# Altium footprint library Connector_PinHeader_2.00mm.PcbLib: 278 footprints (part 13 of 18) (continued)
## PinHeader_2x15_P2.00mm_Horizontal [mm] (continued)
F.CrtYd:
  lines w0.05: -1.5,-29.5 9.7,-29.5 9.7,1.5 -1.5,1.5 -1.5,-29.5
F.Fab:
  lines w0.1: 3.5,-28.25 -0.25,-28.25 -0.25,-27.75 3.5,-27.75 ; 3.5,-26.25 -0.25,-26.25 -0.25,-25.75 3.5,-25.75 ; 3.5,-24.25 -0.25,-24.25 -0.25,-23.75 3.5,-23.75 ; 3.5,-22.25 -0.25,-22.25 -0.25,-21.75 3.5,-21.75 ; 3.5,-20.25 -0.25,-20.25 -0.25,-19.75 3.5,-19.75 ; 3.5,-18.25 -0.25,-18.25 -0.25,-17.75 3.5,-17.75 ; 3.5,-16.25 -0.25,-16.25 -0.25,-15.75 3.5,-15.75 ; 3.5,-14.25 -0.25,-14.25 -0.25,-13.75 3.5,-13.75 ; 3.5,-12.25 -0.25,-12.25 -0.25,-11.75 3.5,-11.75 ; 3.5,-10.25 -0.25,-10.25 -0.25,-9.75 3.5,-9.75 ; 3.5,-8.25 -0.25,-8.25 -0.25,-7.75 3.5,-7.75 ; 3.5,-6.25 -0.25,-6.25 -0.25,-5.75 3.5,-5.75 ; 3.5,-4.25 -0.25,-4.25 -0.25,-3.75 3.5,-3.75 ; 3.5,-2.25 -0.25,-2.25 -0.25,-1.75 3.5,-1.75 ; 3.5,-0.25 -0.25,-0.25 -0.25,0.25 3.5,0.25 ; 5,-28.25 9.2,-28.25 9.2,-27.75 5,-27.75 ; 5,-26.25 9.2,-26.25 9.2,-25.75 5,-25.75 ; 5,-24.25 9.2,-24.25 9.2,-23.75 5,-23.75 ; 5,-22.25 9.2,-22.25 9.2,-21.75 5,-21.75 ; 5,-20.25 9.2,-20.25 9.2,-19.75 5,-19.75 ; 5,-18.25 9.2,-18.25 9.2,-17.75 5,-17.75 ; 5,-16.25 9.2,-16.25 9.2,-15.75 5,-15.75 ; 5,-14.25 9.2,-14.25 9.2,-13.75 5,-13.75 ; 5,-12.25 9.2,-12.25 9.2,-11.75 5,-11.75 ; 5,-10.25 9.2,-10.25 9.2,-9.75 5,-9.75 ; 5,-8.25 9.2,-8.25 9.2,-7.75 5,-7.75 ; 5,-6.25 9.2,-6.25 9.2,-5.75 5,-5.75 ; 5,-4.25 9.2,-4.25 9.2,-3.75 5,-3.75 ; 5,-2.25 9.2,-2.25 9.2,-1.75 5,-1.75 ; 5,-0.25 9.2,-0.25 9.2,0.25 5,0.25 ; 3.5,-29 3.5,0.625 3.875,1 5,1 5,-29 3.5,-29
  text "'.Designator'" at 5.006,-17.642 h0.9

## PinHeader_2x15_P2.00mm_Vertical [mm]
pads (30):
  rect 1.35x1.35 hole 0.8: 1(0,0)
  rrect100% 1.35x1.35 hole 0.8: 2(2,0) 3(0,-2) 4(2,-2) 5(0,-4) 6(2,-4) 7(0,-6) 8(2,-6) 9(0,-8) 10(2,-8) 11(0,-10) 12(2,-10) 13(0,-12) 14(2,-12) 15(0,-14) 16(2,-14) 17(0,-16) 18(2,-16) 19(0,-18) 20(2,-18) 21(0,-20) 22(2,-20) 23(0,-22) 24(2,-22) 25(0,-24) 26(2,-24) 27(0,-26) 28(2,-26) 29(0,-28) 30(2,-28)
F.SilkS:
  lines w0.12: -1.06,0 -1.06,1.06 0,1.06 ; -1.06,-29.06 -1.06,-1 1,-1 1,1.06 3.06,1.06 3.06,-29.06 -1.06,-29.06
F.CrtYd:
  lines w0.05: -1.5,-29.5 3.5,-29.5 3.5,1.5 -1.5,1.5 -1.5,-29.5
F.Fab:
  lines w0.1: -1,-29 3,-29 3,1 0,1 -1,0 -1,-29
  text "'.Designator'" at 1.84,-18.047 h1

## PinHeader_2x15_P2.00mm_Vertical_SMD [mm]
pads (30):
  rect 2.58x1 smd: 1(-2.085,14) 2(2.085,14) 3(-2.085,12) 4(2.085,12) 5(-2.085,10) 6(2.085,10) 7(-2.085,8) 8(2.085,8) 9(-2.085,6) 10(2.085,6) 11(-2.085,4) 12(2.085,4) 13(-2.085,2) 14(2.085,2) 15(-2.085,0) 16(2.085,0) 17(-2.085,-2) 18(2.085,-2) 19(-2.085,-4) 20(2.085,-4) 21(-2.085,-6) 22(2.085,-6) 23(-2.085,-8) 24(2.085,-8) 25(-2.085,-10) 26(2.085,-10) 27(-2.085,-12) 28(2.085,-12) 29(-2.085,-14) 30(2.085,-14)
F.SilkS:
  lines w0.12: -3.315,14.76 -2.06,14.76 -2.06,15.06 2.06,15.06 2.06,14.76 ; -2.06,-14.76 -2.06,-15.06 2.06,-15.06 2.06,-14.76 ; -2.06,-13.24 -2.06,-12.76 ; -2.06,-11.24 -2.06,-10.76 ; -2.06,-9.24 -2.06,-8.76 ; -2.06,-7.24 -2.06,-6.76 ; -2.06,-5.24 -2.06,-4.76 ; -2.06,-3.24 -2.06,-2.76 ; -2.06,-1.24 -2.06,-0.76 ; -2.06,0.76 -2.06,1.24 ; -2.06,2.76 -2.06,3.24 ; -2.06,4.76 -2.06,5.24 ; -2.06,6.76 -2.06,7.24 ; -2.06,8.76 -2.06,9.24 ; -2.06,10.76 -2.06,11.24 ; -2.06,12.76 -2.06,13.24 ; 2.06,-13.24 2.06,-12.76 ; 2.06,-11.24 2.06,-10.76 ; 2.06,-9.24 2.06,-8.76 ; 2.06,-7.24 2.06,-6.76 ; 2.06,-5.24 2.06,-4.76 ; 2.06,-3.24 2.06,-2.76 ; 2.06,-1.24 2.06,-0.76 ; 2.06,0.76 2.06,1.24 ; 2.06,2.76 2.06,3.24 ; 2.06,4.76 2.06,5.24 ; 2.06,6.76 2.06,7.24 ; 2.06,8.76 2.06,9.24 ; 2.06,10.76 2.06,11.24 ; 2.06,12.76 2.06,13.24
F.CrtYd:
  lines w0.05: -4.9,-15.5 -4.9,15.5 4.9,15.5 4.9,-15.5 -4.9,-15.5
F.Fab:
  lines w0.1: -2,-14.25 -2.875,-14.25 -2.875,-13.75 -2,-13.75 ; -2,-12.25 -2.875,-12.25 -2.875,-11.75 -2,-11.75 ; -2,-10.25 -2.875,-10.25 -2.875,-9.75 -2,-9.75 ; -2,-8.25 -2.875,-8.25 -2.875,-7.75 -2,-7.75 ; -2,-6.25 -2.875,-6.25 -2.875,-5.75 -2,-5.75 ; -2,-4.25 -2.875,-4.25 -2.875,-3.75 -2,-3.75 ; -2,-2.25 -2.875,-2.25 -2.875,-1.75 -2,-1.75 ; -2,-0.25 -2.875,-0.25 -2.875,0.25 -2,0.25 ; -2,1.75 -2.875,1.75 -2.875,2.25 -2,2.25 ; -2,3.75 -2.875,3.75 -2.875,4.25 -2,4.25 ; -2,5.75 -2.875,5.75 -2.875,6.25 -2,6.25 ; -2,7.75 -2.875,7.75 -2.875,8.25 -2,8.25 ; -2,9.75 -2.875,9.75 -2.875,10.25 -2,10.25 ; -2,11.75 -2.875,11.75 -2.875,12.25 -2,12.25 ; -2,13.75 -2.875,13.75 -2.875,14.25 -2,14.25 ; 2,-14.25 2.875,-14.25 2.875,-13.75 2,-13.75 ; 2,-12.25 2.875,-12.25 2.875,-11.75 2,-11.75 ; 2,-10.25 2.875,-10.25 2.875,-9.75 2,-9.75 ; 2,-8.25 2.875,-8.25 2.875,-7.75 2,-7.75 ; 2,-6.25 2.875,-6.25 2.875,-5.75 2,-5.75 ; 2,-4.25 2.875,-4.25 2.875,-3.75 2,-3.75 ; 2,-2.25 2.875,-2.25 2.875,-1.75 2,-1.75 ; 2,-0.25 2.875,-0.25 2.875,0.25 2,0.25 ; 2,1.75 2.875,1.75 2.875,2.25 2,2.25 ; 2,3.75 2.875,3.75 2.875,4.25 2,4.25 ; 2,5.75 2.875,5.75 2.875,6.25 2,6.25 ; 2,7.75 2.875,7.75 2.875,8.25 2,8.25 ; 2,9.75 2.875,9.75 2.875,10.25 2,10.25 ; 2,11.75 2.875,11.75 2.875,12.25 2,12.25 ; 2,13.75 2.875,13.75 2.875,14.25 2,14.25 ; -2,14.25 -1.25,15 2,15 2,-15 -2,-15 -2,14.25
  text "'.Designator'" at 0.84,-4.047 h1

## PinHeader_2x16_P2.00mm_Horizontal [mm]
pads (32):
  rect 1.35x1.35 hole 0.8: 1(0,0)
  rrect100% 1.35x1.35 hole 0.8: 2(2,0) 3(0,-2) 4(2,-2) 5(0,-4) 6(2,-4) 7(0,-6) 8(2,-6) 9(0,-8) 10(2,-8) 11(0,-10) 12(2,-10) 13(0,-12) 14(2,-12) 15(0,-14) 16(2,-14) 17(0,-16) 18(2,-16) 19(0,-18) 20(2,-18) 21(0,-20) 22(2,-20) 23(0,-22) 24(2,-22) 25(0,-24) 26(2,-24) 27(0,-26) 28(2,-26) 29(0,-28) 30(2,-28) 31(0,-30) 32(2,-30)
F.SilkS:
  lines w0.12: -1,0 -1,1 0,1 ; 0.882,-30.31 1.118,-30.31 ; 0.882,-29.69 1.118,-29.69 ; 0.882,-28.31 1.118,-28.31 ; 0.882,-27.69 1.118,-27.69 ; 0.882,-26.31 1.118,-26.31 ; 0.882,-25.69 1.118,-25.69 ; 0.882,-24.31 1.118,-24.31 ; 0.882,-23.69 1.118,-23.69 ; 0.882,-22.31 1.118,-22.31 ; 0.882,-21.69 1.118,-21.69 ; 0.882,-20.31 1.118,-20.31 ; 0.882,-19.69 1.118,-19.69 ; 0.882,-18.31 1.118,-18.31 ; 0.882,-17.69 1.118,-17.69 ; 0.882,-16.31 1.118,-16.31 ; 0.882,-15.69 1.118,-15.69 ; 0.882,-14.31 1.118,-14.31 ; 0.882,-13.69 1.118,-13.69 ; 0.882,-12.31 1.118,-12.31 ; 0.882,-11.69 1.118,-11.69 ; 0.882,-10.31 1.118,-10.31 ; 0.882,-9.69 1.118,-9.69 ; 0.882,-8.31 1.118,-8.31 ; 0.882,-7.69 1.118,-7.69 ; 0.882,-6.31 1.118,-6.31 ; 0.882,-5.69 1.118,-5.69 ; 0.882,-4.31 1.118,-4.31 ; 0.882,-3.69 1.118,-3.69 ; 0.882,-2.31 1.118,-2.31 ; 0.882,-1.69 1.118,-1.69 ; 0.935,-0.31 1.118,-0.31 ; 0.935,0.31 1.118,0.31 ; 2.882,-30.31 3.44,-30.31 ; 2.882,-29.69 3.44,-29.69 ; 2.882,-28.31 3.44,-28.31 ; 2.882,-27.69 3.44,-27.69 ; 2.882,-26.31 3.44,-26.31 ; 2.882,-25.69 3.44,-25.69 ; 2.882,-24.31 3.44,-24.31 ; 2.882,-23.69 3.44,-23.69 ; 2.882,-22.31 3.44,-22.31 ; 2.882,-21.69 3.44,-21.69 ; 2.882,-20.31 3.44,-20.31 ; 2.882,-19.69 3.44,-19.69 ; 2.882,-18.31 3.44,-18.31 ; 2.882,-17.69 3.44,-17.69 ; 2.882,-16.31 3.44,-16.31 ; 2.882,-15.69 3.44,-15.69 ; 2.882,-14.31 3.44,-14.31 ; 2.882,-13.69 3.44,-13.69 ; 2.882,-12.31 3.44,-12.31 ; 2.882,-11.69 3.44,-11.69 ; 2.882,-10.31 3.44,-10.31 ; 2.882,-9.69 3.44,-9.69 ; 2.882,-8.31 3.44,-8.31 ; 2.882,-7.69 3.44,-7.69 ; 2.882,-6.31 3.44,-6.31 ; 2.882,-5.69 3.44,-5.69 ; 2.882,-4.31 3.44,-4.31 ; 2.882,-3.69 3.44,-3.69 ; 2.882,-2.31 3.44,-2.31 ; 2.882,-1.69 3.44,-1.69 ; 2.882,-0.31 3.44,-0.31 ; 2.882,0.31 3.44,0.31 ; 3.44,-29 5.06,-29 ; 3.44,-27 5.06,-27 ; 3.44,-25 5.06,-25 ; 3.44,-23 5.06,-23 ; 3.44,-21 5.06,-21 ; 3.44,-19 5.06,-19 ; 3.44,-17 5.06,-17 ; 3.44,-15 5.06,-15 ; 3.44,-13 5.06,-13 ; 3.44,-11 5.06,-11 ; 3.44,-9 5.06,-9 ; 3.44,-7 5.06,-7 ; 3.44,-5 5.06,-5 ; 3.44,-3 5.06,-3 ; 3.44,-1 5.06,-1 ; 5.06,-30.31 9.26,-30.31 9.26,-29.69 5.06,-29.69 ; 5.06,-28.31 9.26,-28.31 9.26,-27.69 5.06,-27.69 ; 5.06,-26.31 9.26,-26.31 9.26,-25.69 5.06,-25.69 ; 5.06,-24.31 9.26,-24.31 9.26,-23.69 5.06,-23.69 ; 5.06,-22.31 9.26,-22.31 9.26,-21.69 5.06,-21.69 ; 5.06,-20.31 9.26,-20.31 9.26,-19.69 5.06,-19.69 ; 5.06,-18.31 9.26,-18.31 9.26,-17.69 5.06,-17.69 ; 5.06,-16.31 9.26,-16.31 9.26,-15.69 5.06,-15.69 ; 5.06,-14.31 9.26,-14.31 9.26,-13.69 5.06,-13.69 ; 5.06,-12.31 9.26,-12.31 9.26,-11.69 5.06,-11.69 ; 5.06,-10.31 9.26,-10.31 9.26,-9.69 5.06,-9.69 ; 5.06,-8.31 9.26,-8.31 9.26,-7.69 5.06,-7.69 ; 5.06,-6.31 9.26,-6.31 9.26,-5.69 5.06,-5.69 ; 5.06,-4.31 9.26,-4.31 9.26,-3.69 5.06,-3.69 ; 5.06,-2.31 9.26,-2.31 9.26,-1.69 5.06,-1.69 ; 5.06,-0.31 9.26,-0.31 9.26,0.31 5.06,0.31 ; 5.06,-0.23 9.26,-0.23 ; 5.06,-0.11 9.26,-0.11 ; 5.06,0.01 9.26,0.01 ; 5.06,0.13 9.26,0.13 ; 5.06,0.25 9.26,0.25 ; 3.44,-31.06 5.06,-31.06 5.06,1.06 3.44,1.06 3.44,-31.06
F.CrtYd:
  lines w0.05: -1.5,-31.5 -1.5,1.5 9.7,1.5 9.7,-31.5 -1.5,-31.5
F.Fab:
  lines w0.1: 3.5,-30.25 -0.25,-30.25 -0.25,-29.75 3.5,-29.75 ; 3.5,-28.25 -0.25,-28.25 -0.25,-27.75 3.5,-27.75 ; 3.5,-26.25 -0.25,-26.25 -0.25,-25.75 3.5,-25.75 ; 3.5,-24.25 -0.25,-24.25 -0.25,-23.75 3.5,-23.75 ; 3.5,-22.25 -0.25,-22.25 -0.25,-21.75 3.5,-21.75 ; 3.5,-20.25 -0.25,-20.25 -0.25,-19.75 3.5,-19.75 ; 3.5,-18.25 -0.25,-18.25 -0.25,-17.75 3.5,-17.75 ; 3.5,-16.25 -0.25,-16.25 -0.25,-15.75 3.5,-15.75 ; 3.5,-14.25 -0.25,-14.25 -0.25,-13.75 3.5,-13.75 ; 3.5,-12.25 -0.25,-12.25 -0.25,-11.75 3.5,-11.75 ; 3.5,-10.25 -0.25,-10.25 -0.25,-9.75 3.5,-9.75 ; 3.5,-8.25 -0.25,-8.25 -0.25,-7.75 3.5,-7.75 ; 3.5,-6.25 -0.25,-6.25 -0.25,-5.75 3.5,-5.75 ; 3.5,-4.25 -0.25,-4.25 -0.25,-3.75 3.5,-3.75 ; 3.5,-2.25 -0.25,-2.25 -0.25,-1.75 3.5,-1.75 ; 3.5,-0.25 -0.25,-0.25 -0.25,0.25 3.5,0.25 ; 5,-30.25 9.2,-30.25 9.2,-29.75 5,-29.75 ; 5,-28.25 9.2,-28.25 9.2,-27.75 5,-27.75 ; 5,-26.25 9.2,-26.25 9.2,-25.75 5,-25.75 ; 5,-24.25 9.2,-24.25 9.2,-23.75 5,-23.75 ; 5,-22.25 9.2,-22.25 9.2,-21.75 5,-21.75 ; 5,-20.25 9.2,-20.25 9.2,-19.75 5,-19.75 ; 5,-18.25 9.2,-18.25 9.2,-17.75 5,-17.75 ; 5,-16.25 9.2,-16.25 9.2,-15.75 5,-15.75 ; 5,-14.25 9.2,-14.25 9.2,-13.75 5,-13.75 ; 5,-12.25 9.2,-12.25 9.2,-11.75 5,-11.75 ; 5,-10.25 9.2,-10.25 9.2,-9.75 5,-9.75 ; 5,-8.25 9.2,-8.25 9.2,-7.75 5,-7.75 ; 5,-6.25 9.2,-6.25 9.2,-5.75 5,-5.75 ; 5,-4.25 9.2,-4.25 9.2,-3.75 5,-3.75 ; 5,-2.25 9.2,-2.25 9.2,-1.75 5,-1.75 ; 5,-0.25 9.2,-0.25 9.2,0.25 5,0.25 ; 3.5,-31 3.5,0.625 3.875,1 5,1 5,-31 3.5,-31
  text "'.Designator'" at 5.006,-18.642 h0.9

## PinHeader_2x16_P2.00mm_Vertical [mm]
pads (32):
  rect 1.35x1.35 hole 0.8: 1(0,0)
  rrect100% 1.35x1.35 hole 0.8: 2(2,0) 3(0,-2) 4(2,-2) 5(0,-4) 6(2,-4) 7(0,-6) 8(2,-6) 9(0,-8) 10(2,-8) 11(0,-10) 12(2,-10) 13(0,-12) 14(2,-12) 15(0,-14) 16(2,-14) 17(0,-16) 18(2,-16) 19(0,-18) 20(2,-18) 21(0,-20) 22(2,-20) 23(0,-22) 24(2,-22) 25(0,-24) 26(2,-24) 27(0,-26) 28(2,-26) 29(0,-28) 30(2,-28) 31(0,-30) 32(2,-30)
F.SilkS:
  lines w0.12: -1.06,0 -1.06,1.06 0,1.06 ; -1.06,-31.06 3.06,-31.06 3.06,1.06 1,1.06 1,-1 -1.06,-1 -1.06,-31.06
F.CrtYd:
  lines w0.05: -1.5,-31.5 -1.5,1.5 3.5,1.5 3.5,-31.5 -1.5,-31.5
F.Fab:
  lines w0.1: -1,-31 -1,0 0,1 3,1 3,-31 -1,-31
  text "'.Designator'" at 1.84,-19.047 h1

## PinHeader_2x16_P2.00mm_Vertical_SMD [mm]
pads (32):
  rect 2.58x1 smd: 1(-2.085,15) 2(2.085,15) 3(-2.085,13) 4(2.085,13) 5(-2.085,11) 6(2.085,11) 7(-2.085,9) 8(2.085,9) 9(-2.085,7) 10(2.085,7) 11(-2.085,5) 12(2.085,5) 13(-2.085,3) 14(2.085,3) 15(-2.085,1) 16(2.085,1) 17(-2.085,-1) 18(2.085,-1) 19(-2.085,-3) 20(2.085,-3) 21(-2.085,-5) 22(2.085,-5) 23(-2.085,-7) 24(2.085,-7) 25(-2.085,-9) 26(2.085,-9) 27(-2.085,-11) 28(2.085,-11) 29(-2.085,-13) 30(2.085,-13) 31(-2.085,-15) 32(2.085,-15)
F.SilkS:
  lines w0.12: -3.315,15.76 -2.06,15.76 -2.06,16.06 2.06,16.06 2.06,15.76 ; -2.06,-15.76 -2.06,-16.06 2.06,-16.06 2.06,-15.76 ; -2.06,-14.24 -2.06,-13.76 ; -2.06,-12.24 -2.06,-11.76 ; -2.06,-10.24 -2.06,-9.76 ; -2.06,-8.24 -2.06,-7.76 ; -2.06,-6.24 -2.06,-5.76 ; -2.06,-4.24 -2.06,-3.76 ; -2.06,-2.24 -2.06,-1.76 ; -2.06,-0.24 -2.06,0.24 ; -2.06,1.76 -2.06,2.24 ; -2.06,3.76 -2.06,4.24 ; -2.06,5.76 -2.06,6.24 ; -2.06,7.76 -2.06,8.24 ; -2.06,9.76 -2.06,10.24 ; -2.06,11.76 -2.06,12.24 ; -2.06,13.76 -2.06,14.24 ; 2.06,-14.24 2.06,-13.76 ; 2.06,-12.24 2.06,-11.76 ; 2.06,-10.24 2.06,-9.76 ; 2.06,-8.24 2.06,-7.76 ; 2.06,-6.24 2.06,-5.76 ; 2.06,-4.24 2.06,-3.76 ; 2.06,-2.24 2.06,-1.76 ; 2.06,-0.24 2.06,0.24 ; 2.06,1.76 2.06,2.24 ; 2.06,3.76 2.06,4.24 ; 2.06,5.76 2.06,6.24 ; 2.06,7.76 2.06,8.24 ; 2.06,9.76 2.06,10.24 ; 2.06,11.76 2.06,12.24 ; 2.06,13.76 2.06,14.24
F.CrtYd:
  lines w0.05: -4.9,-16.5 -4.9,16.5 4.9,16.5 4.9,-16.5 -4.9,-16.5
F.Fab:
  lines w0.1: -2,-15.25 -2.875,-15.25 -2.875,-14.75 -2,-14.75 ; -2,-13.25 -2.875,-13.25 -2.875,-12.75 -2,-12.75 ; -2,-11.25 -2.875,-11.25 -2.875,-10.75 -2,-10.75 ; -2,-9.25 -2.875,-9.25 -2.875,-8.75 -2,-8.75 ; -2,-7.25 -2.875,-7.25 -2.875,-6.75 -2,-6.75 ; -2,-5.25 -2.875,-5.25 -2.875,-4.75 -2,-4.75 ; -2,-3.25 -2.875,-3.25 -2.875,-2.75 -2,-2.75 ; -2,-1.25 -2.875,-1.25 -2.875,-0.75 -2,-0.75 ; -2,0.75 -2.875,0.75 -2.875,1.25 -2,1.25 ; -2,2.75 -2.875,2.75 -2.875,3.25 -2,3.25 ; -2,4.75 -2.875,4.75 -2.875,5.25 -2,5.25 ; -2,6.75 -2.875,6.75 -2.875,7.25 -2,7.25 ; -2,8.75 -2.875,8.75 -2.875,9.25 -2,9.25 ; -2,10.75 -2.875,10.75 -2.875,11.25 -2,11.25 ; -2,12.75 -2.875,12.75 -2.875,13.25 -2,13.25 ; -2,14.75 -2.875,14.75 -2.875,15.25 -2,15.25 ; 2,-15.25 2.875,-15.25 2.875,-14.75 2,-14.75 ; 2,-13.25 2.875,-13.25 2.875,-12.75 2,-12.75 ; 2,-11.25 2.875,-11.25 2.875,-10.75 2,-10.75 ; 2,-9.25 2.875,-9.25 2.875,-8.75 2,-8.75 ; 2,-7.25 2.875,-7.25 2.875,-6.75 2,-6.75 ; 2,-5.25 2.875,-5.25 2.875,-4.75 2,-4.75 ; 2,-3.25 2.875,-3.25 2.875,-2.75 2,-2.75 ; 2,-1.25 2.875,-1.25 2.875,-0.75 2,-0.75 ; 2,0.75 2.875,0.75 2.875,1.25 2,1.25 ; 2,2.75 2.875,2.75 2.875,3.25 2,3.25 ; 2,4.75 2.875,4.75 2.875,5.25 2,5.25 ; 2,6.75 2.875,6.75 2.875,7.25 2,7.25 ; 2,8.75 2.875,8.75 2.875,9.25 2,9.25 ; 2,10.75 2.875,10.75 2.875,11.25 2,11.25 ; 2,12.75 2.875,12.75 2.875,13.25 2,13.25 ; 2,14.75 2.875,14.75 2.875,15.25 2,15.25 ; -2,15.25 -2,-16 2,-16 2,16 -1.25,16 -2,15.25
  text "'.Designator'" at 0.84,-4.047 h1

## PinHeader_2x17_P2.00mm_Horizontal [mm]
pads (34):
  rect 1.35x1.35 hole 0.8: 1(0,0)
  rrect100% 1.35x1.35 hole 0.8: 2(2,0) 3(0,-2) 4(2,-2) 5(0,-4) 6(2,-4) 7(0,-6) 8(2,-6) 9(0,-8) 10(2,-8) 11(0,-10) 12(2,-10) 13(0,-12) 14(2,-12) 15(0,-14) 16(2,-14) 17(0,-16) 18(2,-16) 19(0,-18) 20(2,-18) 21(0,-20) 22(2,-20) 23(0,-22) 24(2,-22) 25(0,-24) 26(2,-24) 27(0,-26) 28(2,-26) 29(0,-28) 30(2,-28) 31(0,-30) 32(2,-30) 33(0,-32) 34(2,-32)
F.SilkS:
  lines w0.12: -1,0 -1,1 0,1 ; 0.882,-32.31 1.118,-32.31 ; 0.882,-31.69 1.118,-31.69 ; 0.882,-30.31 1.118,-30.31 ; 0.882,-29.69 1.118,-29.69 ; 0.882,-28.31 1.118,-28.31 ; 0.882,-27.69 1.118,-27.69 ; 0.882,-26.31 1.118,-26.31 ; 0.882,-25.69 1.118,-25.69 ; 0.882,-24.31 1.118,-24.31 ; 0.882,-23.69 1.118,-23.69 ; 0.882,-22.31 1.118,-22.31 ; 0.882,-21.69 1.118,-21.69 ; 0.882,-20.31 1.118,-20.31 ; 0.882,-19.69 1.118,-19.69 ; 0.882,-18.31 1.118,-18.31 ; 0.882,-17.69 1.118,-17.69 ; 0.882,-16.31 1.118,-16.31 ; 0.882,-15.69 1.118,-15.69 ; 0.882,-14.31 1.118,-14.31 ; 0.882,-13.69 1.118,-13.69 ; 0.882,-12.31 1.118,-12.31 ; 0.882,-11.69 1.118,-11.69 ; 0.882,-10.31 1.118,-10.31 ; 0.882,-9.69 1.118,-9.69 ; 0.882,-8.31 1.118,-8.31 ; 0.882,-7.69 1.118,-7.69 ; 0.882,-6.31 1.118,-6.31 ; 0.882,-5.69 1.118,-5.69 ; 0.882,-4.31 1.118,-4.31 ; 0.882,-3.69 1.118,-3.69 ; 0.882,-2.31 1.118,-2.31 ; 0.882,-1.69 1.118,-1.69 ; 0.935,-0.31 1.118,-0.31 ; 0.935,0.31 1.118,0.31 ; 2.882,-32.31 3.44,-32.31 ; 2.882,-31.69 3.44,-31.69 ; 2.882,-30.31 3.44,-30.31 ; 2.882,-29.69 3.44,-29.69 ; 2.882,-28.31 3.44,-28.31 ; 2.882,-27.69 3.44,-27.69 ; 2.882,-26.31 3.44,-26.31 ; 2.882,-25.69 3.44,-25.69 ; 2.882,-24.31 3.44,-24.31 ; 2.882,-23.69 3.44,-23.69 ; 2.882,-22.31 3.44,-22.31 ; 2.882,-21.69 3.44,-21.69 ; 2.882,-20.31 3.44,-20.31 ; 2.882,-19.69 3.44,-19.69 ; 2.882,-18.31 3.44,-18.31 ; 2.882,-17.69 3.44,-17.69 ; 2.882,-16.31 3.44,-16.31 ; 2.882,-15.69 3.44,-15.69 ; 2.882,-14.31 3.44,-14.31 ; 2.882,-13.69 3.44,-13.69 ; 2.882,-12.31 3.44,-12.31 ; 2.882,-11.69 3.44,-11.69 ; 2.882,-10.31 3.44,-10.31 ; 2.882,-9.69 3.44,-9.69 ; 2.882,-8.31 3.44,-8.31 ; 2.882,-7.69 3.44,-7.69 ; 2.882,-6.31 3.44,-6.31 ; 2.882,-5.69 3.44,-5.69 ; 2.882,-4.31 3.44,-4.31 ; 2.882,-3.69 3.44,-3.69 ; 2.882,-2.31 3.44,-2.31 ; 2.882,-1.69 3.44,-1.69 ; 2.882,-0.31 3.44,-0.31 ; 2.882,0.31 3.44,0.31 ; 3.44,-31 5.06,-31 ; 3.44,-29 5.06,-29 ; 3.44,-27 5.06,-27 ; 3.44,-25 5.06,-25 ; 3.44,-23 5.06,-23 ; 3.44,-21 5.06,-21 ; 3.44,-19 5.06,-19 ; 3.44,-17 5.06,-17 ; 3.44,-15 5.06,-15 ; 3.44,-13 5.06,-13 ; 3.44,-11 5.06,-11 ; 3.44,-9 5.06,-9 ; 3.44,-7 5.06,-7 ; 3.44,-5 5.06,-5 ; 3.44,-3 5.06,-3 ; 3.44,-1 5.06,-1 ; 5.06,-32.31 9.26,-32.31 9.26,-31.69 5.06,-31.69 ; 5.06,-30.31 9.26,-30.31 9.26,-29.69 5.06,-29.69 ; 5.06,-28.31 9.26,-28.31 9.26,-27.69 5.06,-27.69 ; 5.06,-26.31 9.26,-26.31 9.26,-25.69 5.06,-25.69 ; 5.06,-24.31 9.26,-24.31 9.26,-23.69 5.06,-23.69 ; 5.06,-22.31 9.26,-22.31 9.26,-21.69 5.06,-21.69 ; 5.06,-20.31 9.26,-20.31 9.26,-19.69 5.06,-19.69 ; 5.06,-18.31 9.26,-18.31 9.26,-17.69 5.06,-17.69 ; 5.06,-16.31 9.26,-16.31 9.26,-15.69 5.06,-15.69 ; 5.06,-14.31 9.26,-14.31 9.26,-13.69 5.06,-13.69 ; 5.06,-12.31 9.26,-12.31 9.26,-11.69 5.06,-11.69 ; 5.06,-10.31 9.26,-10.31 9.26,-9.69 5.06,-9.69 ; 5.06,-8.31 9.26,-8.31 9.26,-7.69 5.06,-7.69 ; 5.06,-6.31 9.26,-6.31 9.26,-5.69 5.06,-5.69 ; 5.06,-4.31 9.26,-4.31 9.26,-3.69 5.06,-3.69 ; 5.06,-2.31 9.26,-2.31 9.26,-1.69 5.06,-1.69 ; 5.06,-0.31 9.26,-0.31 9.26,0.31 5.06,0.31 ; 5.06,-0.23 9.26,-0.23 ; 5.06,-0.11 9.26,-0.11 ; 5.06,0.01 9.26,0.01 ; 5.06,0.13 9.26,0.13 ; 5.06,0.25 9.26,0.25 ; 3.44,-33.06 3.44,1.06 5.06,1.06 5.06,-33.06 3.44,-33.06
F.CrtYd:
  lines w0.05: -1.5,-33.5 9.7,-33.5 9.7,1.5 -1.5,1.5 -1.5,-33.5
F.Fab:
  lines w0.1: 3.5,-32.25 -0.25,-32.25 -0.25,-31.75 3.5,-31.75 ; 3.5,-30.25 -0.25,-30.25 -0.25,-29.75 3.5,-29.75 ; 3.5,-28.25 -0.25,-28.25 -0.25,-27.75 3.5,-27.75 ; 3.5,-26.25 -0.25,-26.25 -0.25,-25.75 3.5,-25.75 ; 3.5,-24.25 -0.25,-24.25 -0.25,-23.75 3.5,-23.75 ; 3.5,-22.25 -0.25,-22.25 -0.25,-21.75 3.5,-21.75 ; 3.5,-20.25 -0.25,-20.25 -0.25,-19.75 3.5,-19.75 ; 3.5,-18.25 -0.25,-18.25 -0.25,-17.75 3.5,-17.75 ; 3.5,-16.25 -0.25,-16.25 -0.25,-15.75 3.5,-15.75 ; 3.5,-14.25 -0.25,-14.25 -0.25,-13.75 3.5,-13.75 ; 3.5,-12.25 -0.25,-12.25 -0.25,-11.75 3.5,-11.75 ; 3.5,-10.25 -0.25,-10.25 -0.25,-9.75 3.5,-9.75 ; 3.5,-8.25 -0.25,-8.25 -0.25,-7.75 3.5,-7.75 ; 3.5,-6.25 -0.25,-6.25 -0.25,-5.75 3.5,-5.75 ; 3.5,-4.25 -0.25,-4.25 -0.25,-3.75 3.5,-3.75 ; 3.5,-2.25 -0.25,-2.25 -0.25,-1.75 3.5,-1.75 ; 3.5,-0.25 -0.25,-0.25 -0.25,0.25 3.5,0.25 ; 5,-32.25 9.2,-32.25 9.2,-31.75 5,-31.75 ; 5,-30.25 9.2,-30.25 9.2,-29.75 5,-29.75 ; 5,-28.25 9.2,-28.25 9.2,-27.75 5,-27.75 ; 5,-26.25 9.2,-26.25 9.2,-25.75 5,-25.75 ; 5,-24.25 9.2,-24.25 9.2,-23.75 5,-23.75 ; 5,-22.25 9.2,-22.25 9.2,-21.75 5,-21.75 ; 5,-20.25 9.2,-20.25 9.2,-19.75 5,-19.75 ; 5,-18.25 9.2,-18.25 9.2,-17.75 5,-17.75 ; 5,-16.25 9.2,-16.25 9.2,-15.75 5,-15.75 ; 5,-14.25 9.2,-14.25 9.2,-13.75 5,-13.75 ; 5,-12.25 9.2,-12.25 9.2,-11.75 5,-11.75 ; 5,-10.25 9.2,-10.25 9.2,-9.75 5,-9.75 ; 5,-8.25 9.2,-8.25 9.2,-7.75 5,-7.75 ; 5,-6.25 9.2,-6.25 9.2,-5.75 5,-5.75 ; 5,-4.25 9.2,-4.25 9.2,-3.75 5,-3.75 ; 5,-2.25 9.2,-2.25 9.2,-1.75 5,-1.75 ; 5,-0.25 9.2,-0.25 9.2,0.25 5,0.25 ; 3.5,-33 3.5,0.625 3.875,1 5,1 5,-33 3.5,-33
  text "'.Designator'" at 5.006,-19.642 h0.9

## PinHeader_2x17_P2.00mm_Vertical [mm]
pads (34):
  rect 1.35x1.35 hole 0.8: 1(0,0)
  rrect100% 1.35x1.35 hole 0.8: 2(2,0) 3(0,-2) 4(2,-2) 5(0,-4) 6(2,-4) 7(0,-6) 8(2,-6) 9(0,-8) 10(2,-8) 11(0,-10) 12(2,-10) 13(0,-12) 14(2,-12) 15(0,-14) 16(2,-14) 17(0,-16) 18(2,-16) 19(0,-18) 20(2,-18) 21(0,-20) 22(2,-20) 23(0,-22) 24(2,-22) 25(0,-24) 26(2,-24) 27(0,-26) 28(2,-26) 29(0,-28) 30(2,-28) 31(0,-30) 32(2,-30) 33(0,-32) 34(2,-32)
F.SilkS:
  lines w0.12: -1.06,0 -1.06,1.06 0,1.06 ; -1.06,-33.06 3.06,-33.06 3.06,1.06 1,1.06 1,-1 -1.06,-1 -1.06,-33.06
F.CrtYd:
  lines w0.05: -1.5,-33.5 3.5,-33.5 3.5,1.5 -1.5,1.5 -1.5,-33.5
F.Fab:
  lines w0.1: -1,-33 -1,0 0,1 3,1 3,-33 -1,-33
  text "'.Designator'" at 1.84,-20.047 h1